# Altium schematic symbol library altera.SCHLIB: 68 symbols (part 5 of 6)
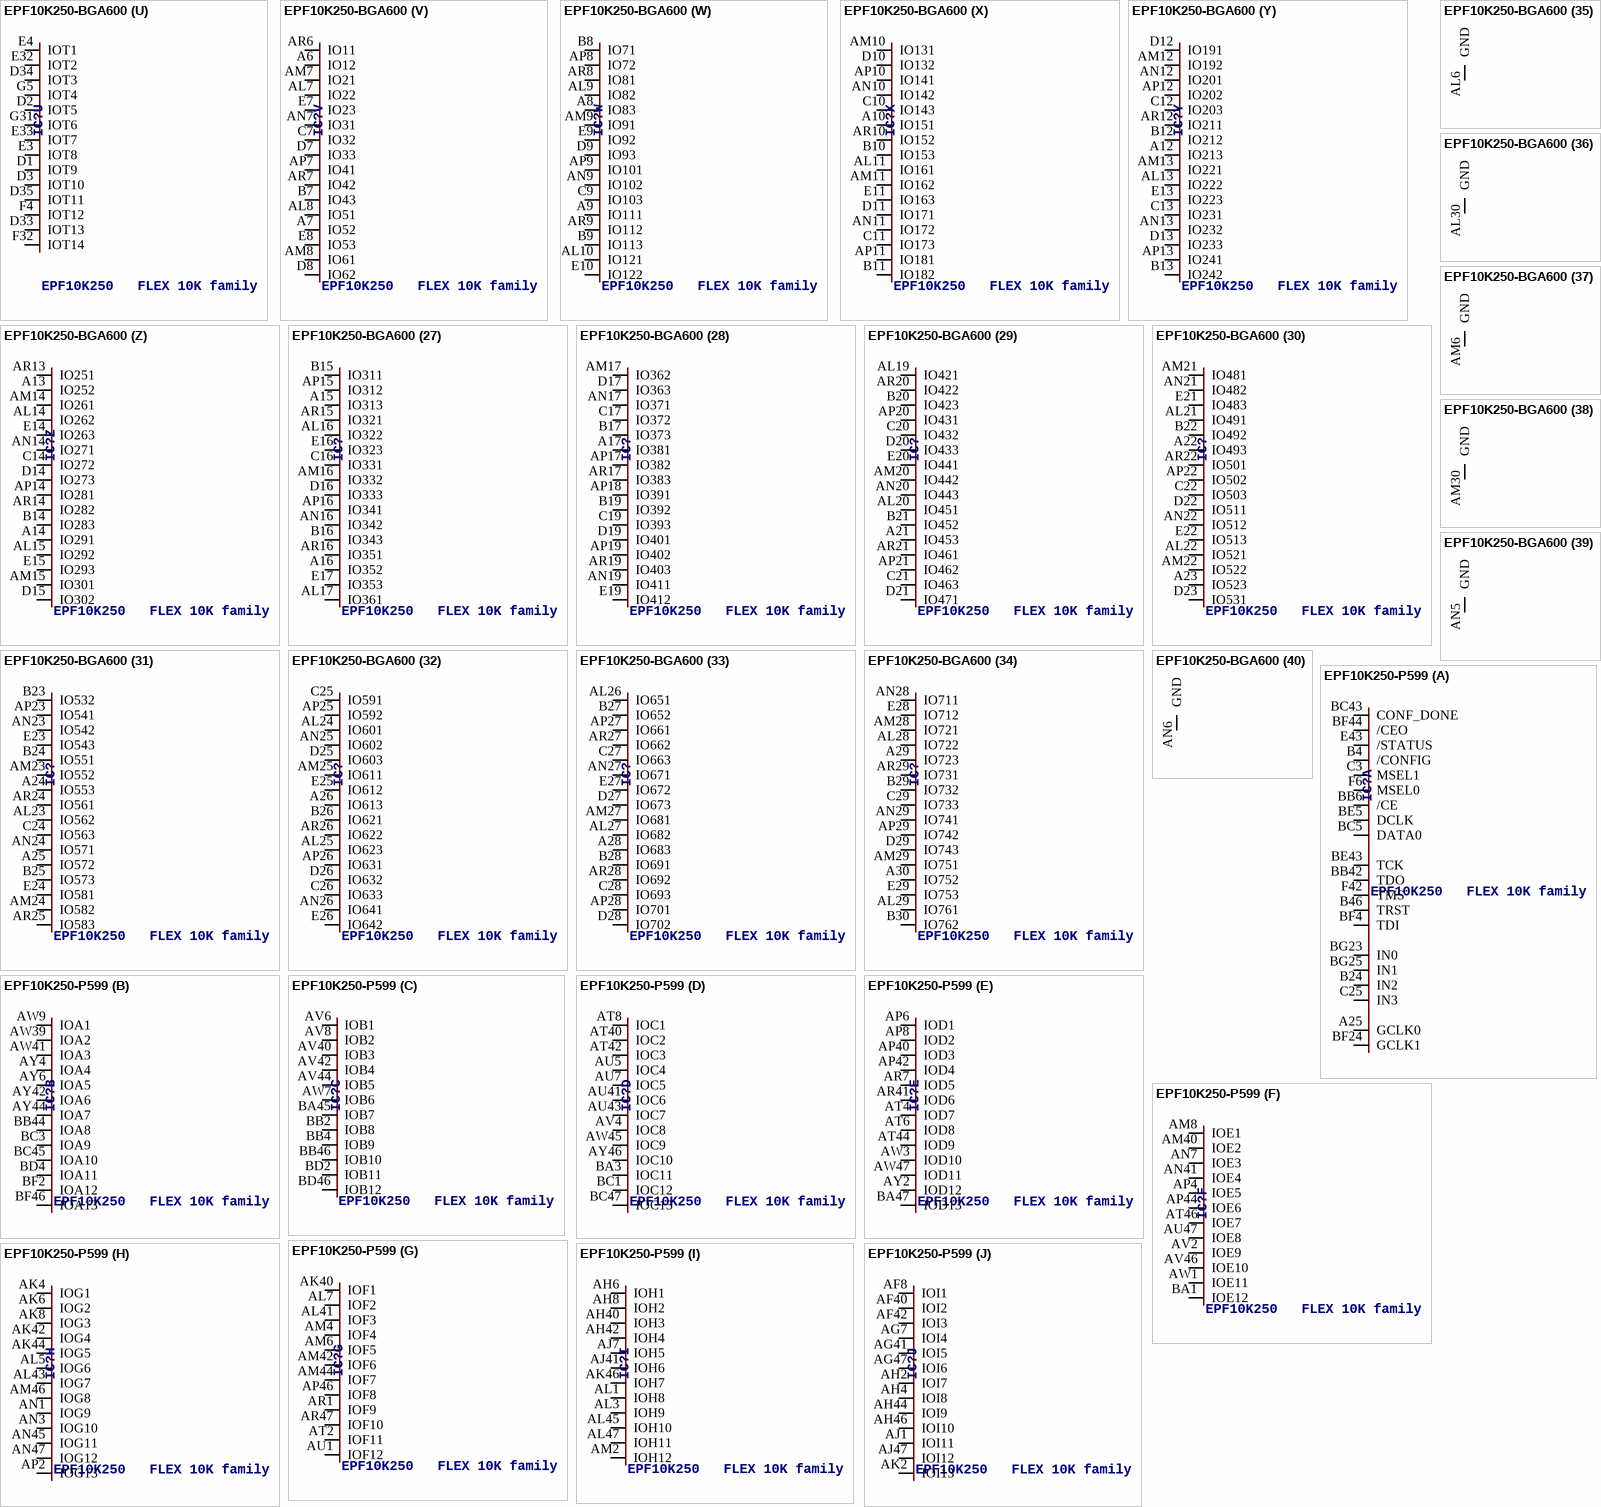
[diagram p61: symbols EPF10K250-BGA600 to EPF10K250-P599]

## EPF10K250-BGA600
designator IC?, comment EPF10K250   FLEX 10K family
OC_FARNELL: unknown; OC_NEWARK: unknown
footprint BGA600
part A pins: AL18 GCLK1, AL31 TCK, AM4 DATA0, AM18 IN1, AM32 CONF_DONE, AN1 TDI, AN2 /CE, AN18 IN0, AN34 TDO, AP1 DCLK, AP35 /CEO, C1 MSEL1, C18 IN2, C34 TRST, C35 TMS, D4 /CONFIG, D18 IN3, D32 /STATUS, E18 GCLK0, F5 MSEL0
part B pins: AJ5 IOA9, AJ31 IOA7, AK5 IOA1, AK32 IOA8, AL4 IOA11, AL32 IOA2, AL33 IOA3, AM1 IOA4, AM2 IOA12, AM3 IOA5, AM33 IOA13, AM34 IOA6, AM35 IOA10
part C pins: AH5 IOB8, AH31 IOB7, AJ4 IOB1, AJ32 IOB4, AK3 IOB11, AK4 IOB9, AK33 IOB10, AK34 IOB5, AL1 IOB2, AL2 IOB6, AL34 IOB12, AL35 IOB3
part D pins: AG31 IOC10, AH4 IOC12, AH32 IOC7, AH33 IOC3, AH34 IOC9, AJ1 IOC4, AJ2 IOC1, AJ3 IOC5, AJ33 IOC2, AJ34 IOC6, AJ35 IOC13, AK1 IOC11, AK2 IOC8
part E pins: AF5 IOD1, AF31 IOD4, AG2 IOD2, AG3 IOD5, AG4 IOD10, AG32 IOD3, AG33 IOD6, AG34 IOD13, AG35 IOD11, AH1 IOD7, AH2 IOD12, AH3 IOD8, AH35 IOD9
part F pins: AE5 IOE1, AE31 IOE8, AE32 IOE2, AE33 IOE7, AF1 IOE9, AF2 IOE3, AF3 IOE11, AF4 IOE5, AF33 IOE6, AF34 IOE10, AF35 IOE4, AG1 IOE12
part G pins: AD3 IOF2, AD4 IOF9, AD5 IOF4, AD31 IOF7, AD32 IOF8, AD33 IOF3, AD34 IOF1, AE1 IOF11, AE2 IOF5, AE3 IOF12, AE34 IOF6, AE35 IOF10
part H pins: AB31 IOG8, AC1 IOG9, AC2 IOG1, AC3 IOG10, AC4 IOG2, AC5 IOG3, AC31 IOG7, AC32 IOG11, AC33 IOG4, AC34 IOG12, AC35 IOG5, AD1 IOG6, AD2 IOG13
part I pins: AA4 IOH8, AA5 IOH1, AA31 IOH4, AA32 IOH7, AB1 IOH9, AB2 IOH2, AB3 IOH12, AB4 IOH5, AB32 IOH6, AB33 IOH10, AB34 IOH3, AB35 IOH11
part J pins: AA1 IOI8, AA2 IOI13, AA3 IOI4, AA34 IOI5, AA35 IOI12, Y3 IOI7, Y4 IOI1, Y5 IOI11, Y31 IOI9, Y32 IOI10, Y33 IOI2, Y34 IOI6, Y35 IOI3
part K pins: V5 IOJ2, V31 IOJ5, W1 IOJ1, W2 IOJ3, W3 IOJ8, W4 IOJ9, W5 IOJ13, W31 IOJ12, W32 IOJ11, W33 IOJ6, W34 IOJ4, W35 IOJ7, Y1 IOJ10
part L pins: U4 IOK3, U5 IOK1, U31 IOK5, U32 IOK7, U33 IOK4, V1 IOK2, V2 IOK8, V3 IOK9, V4 IOK12, V33 IOK11, V34 IOK10, V35 IOK6
part M pins: T2 IOL5, T3 IOL1, T4 IOL6, T5 IOL3, T31 IOL2, T32 IOL7, T33 IOL12, T34 IOL8, U1 IOL4, U2 IOL11, U34 IOL10, U35 IOL9
part N pins: P31 IOM12, P32 IOM3, R1 IOM11, R2 IOM5, R3 IOM10, R4 IOM7, R5 IOM1, R31 IOM8, R32 IOM2, R33 IOM6, R34 IOM13, R35 IOM4, T1 IOM9
part O pins: N3 ION7, N4 ION6, N5 ION2, N31 ION8, N32 ION9, N33 ION1, P1 ION10, P2 ION5, P3 ION12, P4 ION4, P33 ION13, P34 ION3, P35 ION11
part P pins: L35 IOO7, M1 IOO8, M3 IOO2, M4 IOO9, M5 IOO5, M31 IOO11, M32 IOO3, M33 IOO10, M34 IOO1, M35 IOO6, N1 IOO4, N2 IOO12, N35 IOO13
part Q pins: K1 IOP2, K2 IOP8, K33 IOP7, K34 IOP9, K35 IOP1, L1 IOP10, L2 IOP6, L3 IOP11, L4 IOP12, L5 IOP4, L31 IOP3, L32 IOP13, L33 IOP14, L34 IOP5
part R pins: H34 IOQ7, H35 IOQ1, J1 IOQ12, J2 IOQ2, J3 IOQ8, J4 IOQ3, J32 IOQ9, J33 IOQ4, J34 IOQ13, J35 IOQ14, K3 IOQ6, K4 IOQ10, K5 IOQ11, K31 IOQ5
part S pins: G1 IOR5, G2 IOR10, G33 IOR6, G34 IOR4, G35 IOR7, H2 IOR8, H3 IOR3, H4 IOR1, H32 IOR11, H33 IOR2, J5 IOR9, J31 IOR12
part T pins: E1 IOS9, E34 IOS10, E35 IOS2, F1 IOS6, F2 IOS7, F3 IOS1, F33 IOS11, F34 IOS5, G3 IOS13, G4 IOS8, G32 IOS3, H5 IOS4, H31 IOS12
part U pins: D1 IOT9, D2 IOT5, D3 IOT10, D33 IOT13, D34 IOT3, D35 IOT11, E3 IOT8, E4 IOT1, E32 IOT2, E33 IOT7, F4 IOT12, F32 IOT14, G5 IOT4, G31 IOT6
part V pins: A6 IO12, A7 IO52, AL7 IO22, AL8 IO51, AM7 IO21, AM8 IO61, AN7 IO31, AP7 IO41, AR6 IO11, AR7 IO42, B7 IO43, C7 IO32, D7 IO33, D8 IO62, E7 IO23, E8 IO53
part W pins: A8 IO83, A9 IO111, AL9 IO82, AL10 IO121, AM9 IO91, AN9 IO102, AP8 IO72, AP9 IO101, AR8 IO81, AR9 IO112, B8 IO71, B9 IO113, C9 IO103, D9 IO93, E9 IO92, E10 IO122
part X pins: A10 IO151, AL11 IO161, AM10 IO131, AM11 IO162, AN10 IO142, AN11 IO172, AP10 IO141, AP11 IO181, AR10 IO152, B10 IO153, B11 IO182, C10 IO143, C11 IO173, D10 IO132, D11 IO171, E11 IO163
part Y pins: A12 IO213, AL13 IO222, AM12 IO192, AM13 IO221, AN12 IO201, AN13 IO232, AP12 IO202, AP13 IO241, AR12 IO211, B12 IO212, B13 IO242, C12 IO203, C13 IO231, D12 IO191, D13 IO233, E13 IO223
part Z pins: A13 IO252, A14 IO291, AL14 IO262, AL15 IO292, AM14 IO261, AM15 IO301, AN14 IO271, AP14 IO281, AR13 IO251, AR14 IO282, B14 IO283, C14 IO272, D14 IO273, D15 IO302, E14 IO263, E15 IO293
part 27 pins: A15 IO313, A16 IO352, AL16 IO322, AL17 IO361, AM16 IO332, AN16 IO342, AP15 IO312, AP16 IO341, AR15 IO321, AR16 IO351, B15 IO311, B16 IO343, C16 IO331, D16 IO333, E16 IO323, E17 IO353
part 28 pins: A17 IO381, AM17 IO362, AN17 IO371, AN19 IO411, AP17 IO382, AP18 IO391, AP19 IO402, AR17 IO383, AR19 IO403, B17 IO373, B19 IO392, C17 IO372, C19 IO393, D17 IO363, D19 IO401, E19 IO412
part 29 pins: A21 IO453, AL19 IO421, AL20 IO451, AM20 IO442, AN20 IO443, AP20 IO431, AP21 IO462, AR20 IO422, AR21 IO461, B20 IO423, B21 IO452, C20 IO432, C21 IO463, D20 IO433, D21 IO471, E20 IO441
part 30 pins: A22 IO493, A23 IO523, AL21 IO491, AL22 IO521, AM21 IO481, AM22 IO522, AN21 IO482, AN22 IO512, AP22 IO502, AR22 IO501, B22 IO492, C22 IO503, D22 IO511, D23 IO531, E21 IO483, E22 IO513
part 31 pins: A24 IO553, A25 IO572, AL23 IO562, AM23 IO552, AM24 IO582, AN23 IO542, AN24 IO571, AP23 IO541, AR24 IO561, AR25 IO583, B23 IO532, B24 IO551, B25 IO573, C24 IO563, E23 IO543, E24 IO581
part 32 pins: A26 IO613, AL24 IO601, AL25 IO623, AM25 IO611, AN25 IO602, AN26 IO641, AP25 IO592, AP26 IO631, AR26 IO622, B26 IO621, C25 IO591, C26 IO633, D25 IO603, D26 IO632, E25 IO612, E26 IO642
part 33 pins: A28 IO683, AL26 IO651, AL27 IO682, AM27 IO681, AN27 IO671, AP27 IO661, AP28 IO701, AR27 IO662, AR28 IO692, B27 IO652, B28 IO691, C27 IO663, C28 IO693, D27 IO673, D28 IO702, E27 IO672
part 34 pins: A29 IO723, A30 IO752, AL28 IO722, AL29 IO761, AM28 IO721, AM29 IO751, AN28 IO711, AN29 IO741, AP29 IO742, AR29 IO731, B29 IO732, B30 IO762, C29 IO733, D29 IO743, E28 IO712, E29 IO753
part 35 pins: AL6 GND (power)
part 36 pins: AL30 GND (power)
part 37 pins: AM6 GND (power)
part 38 pins: AM30 GND (power)
part 39 pins: AN5 GND (power)
part 40 pins: AN6 GND (power)
part 41 pins: AN30 GND (power)
part 42 pins: AN31 GND (power)
part 43 pins: AN35 GND (power)
part 44 pins: AP2 GND (power)
part 45 pins: AP3 GND (power)
part 46 pins: AP4 GND (power)
part 47 pins: AP5 GND (power)
part 48 pins: AP6 GND (power)
part 49 pins: AP30 GND (power)
part 50 pins: AP31 GND (power)
part 51 pins: AP32 GND (power)
part 52 pins: AP33 GND (power)
part 53 pins: AR1 GND (power)
part 54 pins: AR2 GND (power)
part 55 pins: AR3 GND (power)
part 56 pins: AR4 GND (power)
part 57 pins: AR5 GND (power)
part 58 pins: AR30 GND (power)
part 59 pins: AR31 GND (power)
part 60 pins: AR32 GND (power)
part 61 pins: AR33 GND (power)
part 62 pins: AR34 GND (power)
part 63 pins: AR35 GND (power)
part 64 pins: A1 GND (power)
part 65 pins: A2 GND (power)
part 66 pins: A3 GND (power)
part 67 pins: A4 GND (power)
part 68 pins: A5 GND (power)
part 69 pins: A18 GND (power)
part 70 pins: A31 GND (power)
part 71 pins: A32 GND (power)
part 72 pins: A33 GND (power)
part 73 pins: A34 GND (power)
part 74 pins: A35 GND (power)
part 75 pins: B2 GND (power)
part 76 pins: B3 GND (power)
part 77 pins: B4 GND (power)
part 78 pins: B5 GND (power)
part 79 pins: B6 GND (power)
part 80 pins: B31 GND (power)
part 81 pins: B32 GND (power)
part 82 pins: B33 GND (power)
part 83 pins: B34 GND (power)
part 84 pins: B35 GND (power)
part 85 pins: C5 GND (power)
part 86 pins: C6 GND (power)
part 87 pins: C30 GND (power)
part 88 pins: C31 GND (power)
part 89 pins: D6 GND (power)
part 90 pins: D30 GND (power)
part 91 pins: E6 GND (power)
part 92 pins: E30 GND (power)
part 93 pins: AA33 VCC (power)
part 94 pins: AB5 VCC (power)
part 95 pins: AD35 VCC (power)
part 96 pins: AE4 VCC (power)
part 97 pins: AF32 VCC (power)
part 98 pins: AG5 VCC (power)
part 99 pins: AK31 VCC (power)
part 100 pins: AK35 VCC (power)
part 101 pins: AL3 VCC (power)
part 102 pins: AP24 VCC (power)
part 103 pins: AR11 VCC (power)
part 104 pins: AR18 VCC (power)
part 105 pins: A11 VCC (power)
part 106 pins: A19 VCC (power)
part 107 pins: B1 VCC (power)
part 108 pins: B18 VCC (power)
part 109 pins: D24 VCC (power)
part 110 pins: E2 VCC (power)
part 111 pins: F31 VCC (power)
part 112 pins: F35 VCC (power)
part 113 pins: H1 VCC (power)
part 114 pins: K32 VCC (power)
part 115 pins: M2 VCC (power)
part 116 pins: N34 VCC (power)
part 117 pins: P5 VCC (power)
part 118 pins: T35 VCC (power)
part 119 pins: U3 VCC (power)
part 120 pins: V32 VCC (power)
part 121 pins: Y2 VCC (power)
part 122 pins: AL5 VCCIO (power)
part 123 pins: AL12 VCCIO (power)
part 124 pins: AM5 VCCIO (power)
part 125 pins: AM19 VCCIO (power)
part 126 pins: AM26 VCCIO (power)
part 127 pins: AM31 VCCIO (power)
part 128 pins: AN3 VCCIO (power)
part 129 pins: AN4 VCCIO (power)
part 130 pins: AN8 VCCIO (power)
part 131 pins: AN15 VCCIO (power)
part 132 pins: AN32 VCCIO (power)
part 133 pins: AN33 VCCIO (power)
part 134 pins: AP34 VCCIO (power)
part 135 pins: AR23 VCCIO (power)
part 136 pins: A20 VCCIO (power)
part 137 pins: A27 VCCIO (power)
part 138 pins: C2 VCCIO (power)
part 139 pins: C3 VCCIO (power)
part 140 pins: C4 VCCIO (power)
part 141 pins: C8 VCCIO (power)
part 142 pins: C15 VCCIO (power)
part 143 pins: C23 VCCIO (power)
part 144 pins: C32 VCCIO (power)
part 145 pins: C33 VCCIO (power)
part 146 pins: D5 VCCIO (power)
part 147 pins: D31 VCCIO (power)
part 148 pins: E5 VCCIO (power)
part 149 pins: E12 VCCIO (power)
part 150 pins: E31 VCCIO (power)

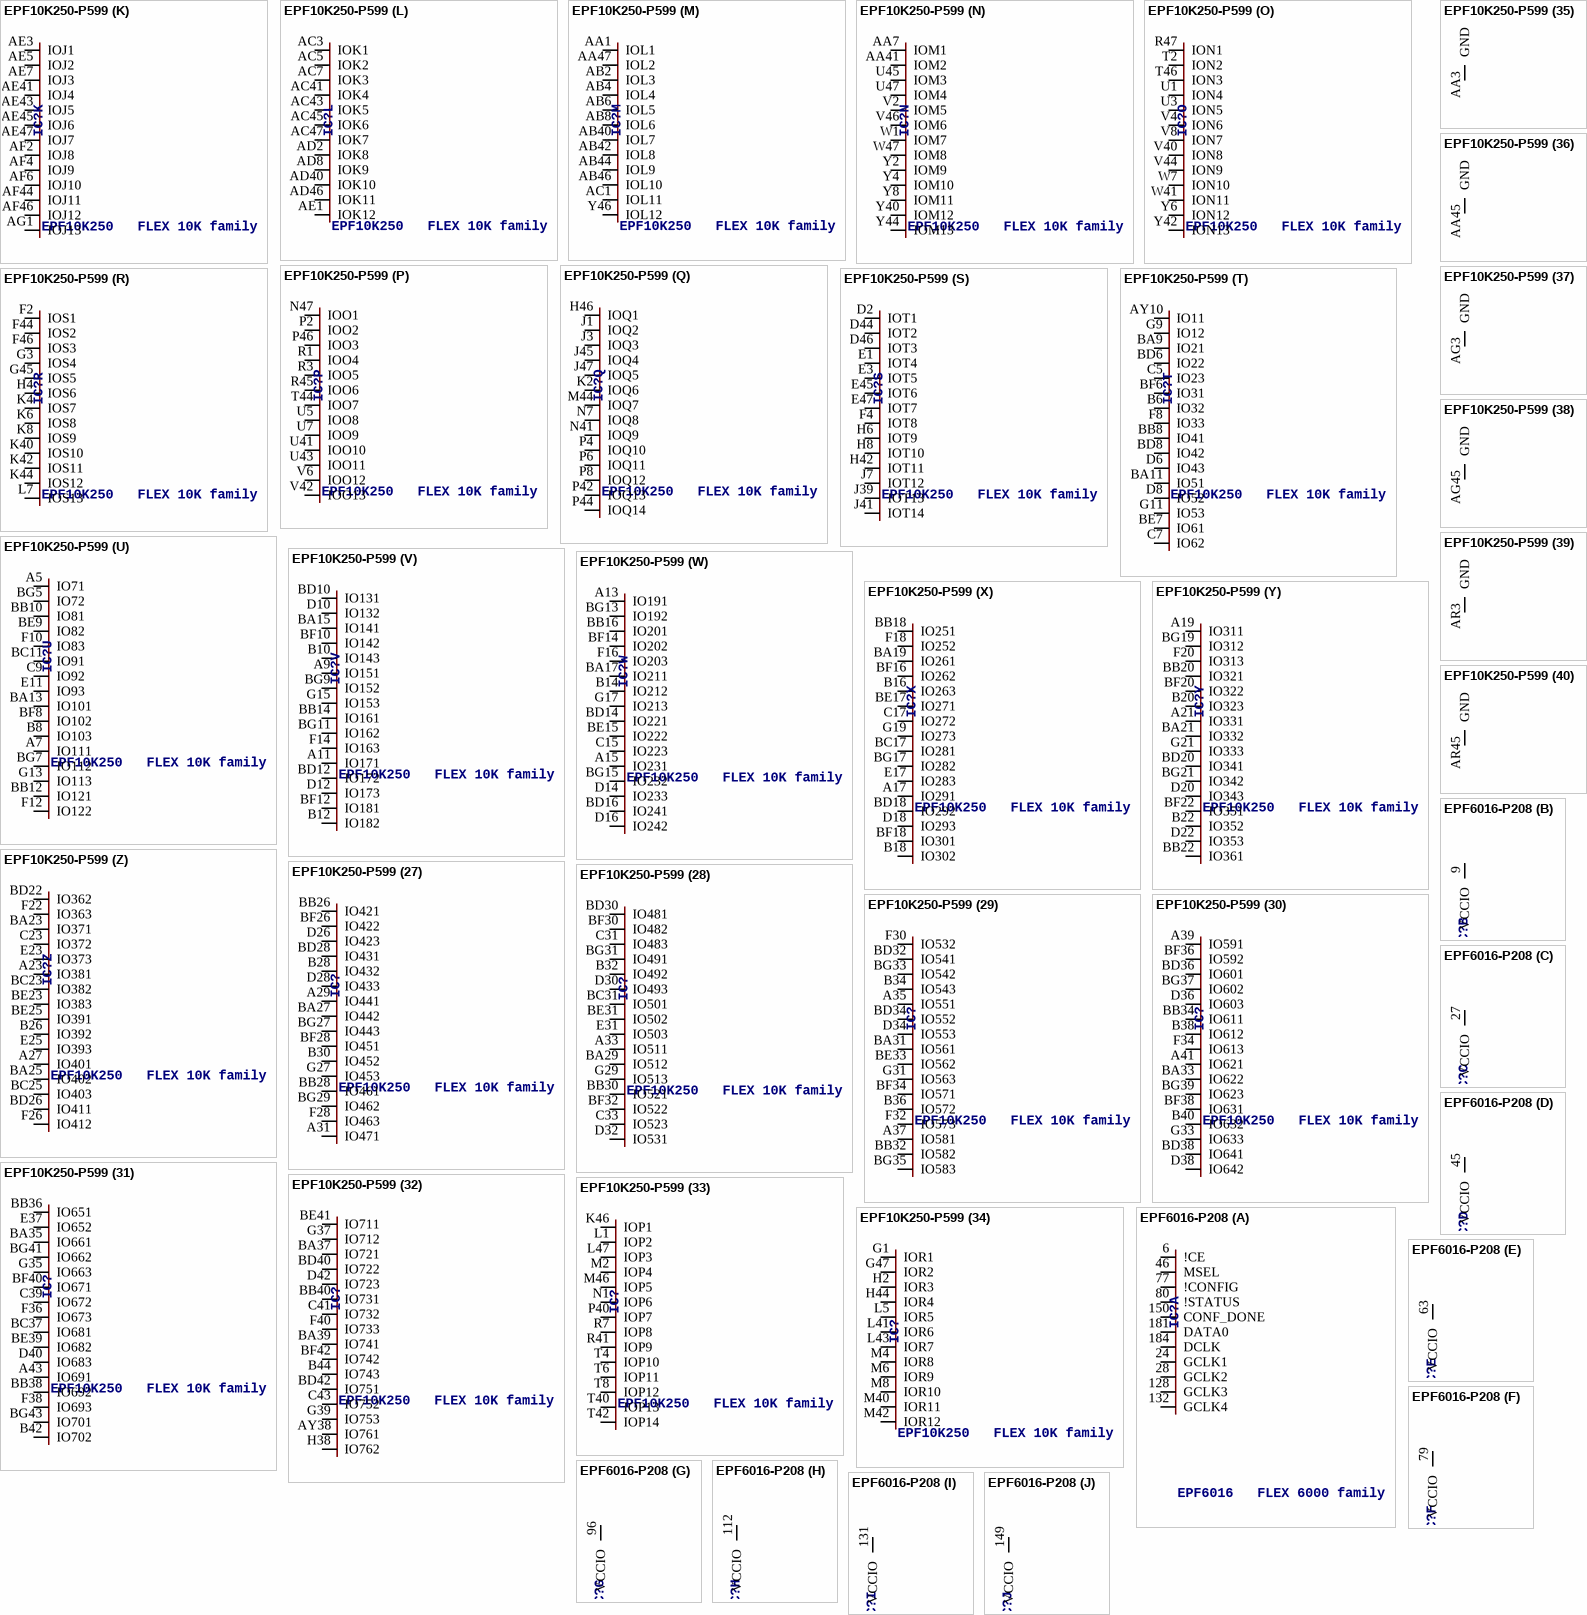
[diagram p37: symbols EPF10K250-P599 to EPF6016-P208]

## EPF10K250-P599
designator IC?, comment EPF10K250   FLEX 10K family
OC_FARNELL: unknown; OC_NEWARK: unknown
footprint PGA599
part A pins: A25 GCLK0, B4 /CONFIG, B24 IN2, B46 TRST, BB6 /CE, BB42 TDO, BC5 DATA0, BC43 CONF_DONE, BE5 DCLK, BE43 TCK, BF4 TDI, BF24 GCLK1, BF44 /CEO, BG23 IN0, BG25 IN1, C3 MSEL1, C25 IN3, E43 /STATUS, F6 MSEL0, F42 TMS
part B pins: AW9 IOA1, AW39 IOA2, AW41 IOA3, AY4 IOA4, AY6 IOA5, AY42 IOA6, AY44 IOA7, BB44 IOA8, BC3 IOA9, BC45 IOA10, BD4 IOA11, BF2 IOA12, BF46 IOA13
part C pins: AV6 IOB1, AV8 IOB2, AV40 IOB3, AV42 IOB4, AV44 IOB5, AW7 IOB6, BA45 IOB7, BB2 IOB8, BB4 IOB9, BB46 IOB10, BD2 IOB11, BD46 IOB12
part D pins: AT8 IOC1, AT40 IOC2, AT42 IOC3, AU5 IOC4, AU7 IOC5, AU41 IOC6, AU43 IOC7, AV4 IOC8, AW45 IOC9, AY46 IOC10, BA3 IOC11, BC1 IOC12, BC47 IOC13
part E pins: AP6 IOD1, AP8 IOD2, AP40 IOD3, AP42 IOD4, AR7 IOD5, AR41 IOD6, AT4 IOD7, AT6 IOD8, AT44 IOD9, AW3 IOD10, AW47 IOD11, AY2 IOD12, BA47 IOD13
part F pins: AM8 IOE1, AM40 IOE2, AN7 IOE3, AN41 IOE4, AP4 IOE5, AP44 IOE6, AT46 IOE7, AU47 IOE8, AV2 IOE9, AV46 IOE10, AW1 IOE11, BA1 IOE12
part G pins: AK40 IOF1, AL7 IOF2, AL41 IOF3, AM4 IOF4, AM6 IOF5, AM42 IOF6, AM44 IOF7, AP46 IOF8, AR1 IOF9, AR47 IOF10, AT2 IOF11, AU1 IOF12
part H pins: AK4 IOG1, AK6 IOG2, AK8 IOG3, AK42 IOG4, AK44 IOG5, AL5 IOG6, AL43 IOG7, AM46 IOG8, AN1 IOG9, AN3 IOG10, AN45 IOG11, AN47 IOG12, AP2 IOG13
part I pins: AH6 IOH1, AH8 IOH2, AH40 IOH3, AH42 IOH4, AJ7 IOH5, AJ41 IOH6, AK46 IOH7, AL1 IOH8, AL3 IOH9, AL45 IOH10, AL47 IOH11, AM2 IOH12
part J pins: AF8 IOI1, AF40 IOI2, AF42 IOI3, AG7 IOI4, AG41 IOI5, AG47 IOI6, AH2 IOI7, AH4 IOI8, AH44 IOI9, AH46 IOI10, AJ1 IOI11, AJ47 IOI12, AK2 IOI13
part K pins: AE3 IOJ1, AE5 IOJ2, AE7 IOJ3, AE41 IOJ4, AE43 IOJ5, AE45 IOJ6, AE47 IOJ7, AF2 IOJ8, AF4 IOJ9, AF6 IOJ10, AF44 IOJ11, AF46 IOJ12, AG1 IOJ13
part L pins: AC3 IOK1, AC5 IOK2, AC7 IOK3, AC41 IOK4, AC43 IOK5, AC45 IOK6, AC47 IOK7, AD2 IOK8, AD8 IOK9, AD40 IOK10, AD46 IOK11, AE1 IOK12
part M pins: AA1 IOL1, AA47 IOL2, AB2 IOL3, AB4 IOL4, AB6 IOL5, AB8 IOL6, AB40 IOL7, AB42 IOL8, AB44 IOL9, AB46 IOL10, AC1 IOL11, Y46 IOL12
part N pins: AA7 IOM1, AA41 IOM2, U45 IOM3, U47 IOM4, V2 IOM5, V46 IOM6, W1 IOM7, W47 IOM8, Y2 IOM9, Y4 IOM10, Y8 IOM11, Y40 IOM12, Y44 IOM13
part O pins: R47 ION1, T2 ION2, T46 ION3, U1 ION4, U3 ION5, V4 ION6, V8 ION7, V40 ION8, V44 ION9, W7 ION10, W41 ION11, Y6 ION12, Y42 ION13
part P pins: N47 IOO1, P2 IOO2, P46 IOO3, R1 IOO4, R3 IOO5, R45 IOO6, T44 IOO7, U5 IOO8, U7 IOO9, U41 IOO10, U43 IOO11, V6 IOO12, V42 IOO13
part Q pins: H46 IOQ1, J1 IOQ2, J3 IOQ3, J45 IOQ4, J47 IOQ5, K2 IOQ6, M44 IOQ7, N7 IOQ8, N41 IOQ9, P4 IOQ10, P6 IOQ11, P8 IOQ12, P42 IOQ13, P44 IOQ14
part R pins: F2 IOS1, F44 IOS2, F46 IOS3, G3 IOS4, G45 IOS5, H4 IOS6, K4 IOS7, K6 IOS8, K8 IOS9, K40 IOS10, K42 IOS11, K44 IOS12, L7 IOS13
part S pins: D2 IOT1, D44 IOT2, D46 IOT3, E1 IOT4, E3 IOT5, E45 IOT6, E47 IOT7, F4 IOT8, H6 IOT9, H8 IOT10, H42 IOT11, J7 IOT12, J39 IOT13, J41 IOT14
part T pins: AY10 IO11, B6 IO32, BA9 IO21, BA11 IO51, BB8 IO41, BD6 IO22, BD8 IO42, BE7 IO61, BF6 IO31, C5 IO23, C7 IO62, D6 IO43, D8 IO52, F8 IO33, G9 IO12, G11 IO53
part U pins: A5 IO71, A7 IO111, B8 IO103, BA13 IO101, BB10 IO81, BB12 IO121, BC11 IO91, BE9 IO82, BF8 IO102, BG5 IO72, BG7 IO112, C9 IO92, E11 IO93, F10 IO83, F12 IO122, G13 IO113
part V pins: A9 IO151, A11 IO171, B10 IO143, B12 IO182, BA15 IO141, BB14 IO161, BD10 IO131, BD12 IO172, BF10 IO142, BF12 IO181, BG9 IO152, BG11 IO162, D10 IO132, D12 IO173, F14 IO163, G15 IO153
part W pins: A13 IO191, A15 IO231, B14 IO212, BA17 IO211, BB16 IO201, BD14 IO221, BD16 IO241, BE15 IO222, BF14 IO202, BG13 IO192, BG15 IO232, C15 IO223, D14 IO233, D16 IO242, F16 IO203, G17 IO213
part X pins: A17 IO291, B16 IO263, B18 IO302, BA19 IO261, BB18 IO251, BC17 IO281, BD18 IO292, BE17 IO271, BF16 IO262, BF18 IO301, BG17 IO282, C17 IO272, D18 IO293, E17 IO283, F18 IO252, G19 IO273
part Y pins: A19 IO311, A21 IO331, B20 IO323, B22 IO352, BA21 IO332, BB20 IO321, BB22 IO361, BD20 IO341, BF20 IO322, BF22 IO351, BG19 IO312, BG21 IO342, D20 IO343, D22 IO353, F20 IO313, G21 IO333
part Z pins: A23 IO381, A27 IO401, B26 IO392, BA23 IO371, BA25 IO402, BC23 IO382, BC25 IO403, BD22 IO362, BD26 IO411, BE23 IO383, BE25 IO391, C23 IO372, E23 IO373, E25 IO393, F22 IO363, F26 IO412
part 27 pins: A29 IO441, A31 IO471, B28 IO432, B30 IO452, BA27 IO442, BB26 IO421, BB28 IO461, BD28 IO431, BF26 IO422, BF28 IO451, BG27 IO443, BG29 IO462, D26 IO423, D28 IO433, F28 IO463, G27 IO453
part 28 pins: A33 IO511, B32 IO492, BA29 IO512, BB30 IO521, BC31 IO501, BD30 IO481, BE31 IO502, BF30 IO482, BF32 IO522, BG31 IO491, C31 IO483, C33 IO523, D30 IO493, D32 IO531, E31 IO503, G29 IO513
part 29 pins: A35 IO551, A37 IO581, B34 IO543, B36 IO572, BA31 IO561, BB32 IO582, BD32 IO541, BD34 IO552, BE33 IO562, BF34 IO571, BG33 IO542, BG35 IO583, D34 IO553, F30 IO532, F32 IO573, G31 IO563
part 30 pins: A39 IO591, A41 IO621, B38 IO612, B40 IO632, BA33 IO622, BB34 IO611, BD36 IO601, BD38 IO641, BF36 IO592, BF38 IO631, BG37 IO602, BG39 IO623, D36 IO603, D38 IO642, F34 IO613, G33 IO633
part 31 pins: A43 IO691, B42 IO702, BA35 IO661, BB36 IO651, BB38 IO692, BC37 IO681, BE39 IO682, BF40 IO671, BG41 IO662, BG43 IO701, C39 IO672, D40 IO683, E37 IO652, F36 IO673, F38 IO693, G35 IO663
part 32 pins: AY38 IO761, B44 IO743, BA37 IO721, BA39 IO741, BB40 IO731, BD40 IO722, BD42 IO751, BE41 IO711, BF42 IO742, C41 IO732, C43 IO752, D42 IO723, F40 IO733, G37 IO712, G39 IO753, H38 IO762
part 33 pins: K46 IOP1, L1 IOP2, L47 IOP3, M2 IOP4, M46 IOP5, N1 IOP6, P40 IOP7, R7 IOP8, R41 IOP9, T4 IOP10, T6 IOP11, T8 IOP12, T40 IOP13, T42 IOP14
part 34 pins: G1 IOR1, G47 IOR2, H2 IOR3, H44 IOR4, L5 IOR5, L41 IOR6, L43 IOR7, M4 IOR8, M6 IOR9, M8 IOR10, M40 IOR11, M42 IOR12
part 35 pins: AA3 GND (power)
part 36 pins: AA45 GND (power)
part 37 pins: AG3 GND (power)
part 38 pins: AG45 GND (power)
part 39 pins: AR3 GND (power)
part 40 pins: AR45 GND (power)
part 41 pins: A47 GND (power)
part 42 pins: BD44 GND (power)
part 43 pins: BE3 GND (power)
part 44 pins: BE13 GND (power)
part 45 pins: BE21 GND (power)
part 46 pins: BE27 GND (power)
part 47 pins: BE35 GND (power)
part 48 pins: BE45 GND (power)
part 49 pins: BG1 GND (power)
part 50 pins: BG47 GND (power)
part 51 pins: B2 GND (power)
part 52 pins: C13 GND (power)
part 53 pins: C21 GND (power)
part 54 pins: C27 GND (power)
part 55 pins: C35 GND (power)
part 56 pins: C45 GND (power)
part 57 pins: D4 GND (power)
part 58 pins: G23 GND (power)
part 59 pins: N3 GND (power)
part 60 pins: N45 GND (power)
part 61 pins: AD6 GNDIO (power)
part 62 pins: AD42 GNDIO (power)
part 63 pins: AJ5 GNDIO (power)
part 64 pins: AJ43 GNDIO (power)
part 65 pins: AR5 GNDIO (power)
part 66 pins: AR43 GNDIO (power)
part 67 pins: AY8 GNDIO (power)
part 68 pins: AY40 GNDIO (power)
part 69 pins: BA5 GNDIO (power)
part 70 pins: BA43 GNDIO (power)
part 71 pins: BB24 GNDIO (power)
part 72 pins: BC7 GNDIO (power)
part 73 pins: BC13 GNDIO (power)
part 74 pins: BC19 GNDIO (power)
part 75 pins: BC29 GNDIO (power)
part 76 pins: BC35 GNDIO (power)
part 77 pins: BC41 GNDIO (power)
part 78 pins: E7 GNDIO (power)
part 79 pins: E13 GNDIO (power)
part 80 pins: E19 GNDIO (power)
part 81 pins: E29 GNDIO (power)
part 82 pins: E35 GNDIO (power)
part 83 pins: E41 GNDIO (power)
part 84 pins: F24 GNDIO (power)
part 85 pins: G5 GNDIO (power)
part 86 pins: G43 GNDIO (power)
part 87 pins: H40 GNDIO (power)
part 88 pins: N5 GNDIO (power)
part 89 pins: N43 GNDIO (power)
part 90 pins: W5 GNDIO (power)
part 91 pins: W43 GNDIO (power)
part 92 pins: AJ3 VCC (power)
part 93 pins: AJ45 VCC (power)
part 94 pins: AU3 VCC (power)
part 95 pins: AU45 VCC (power)
part 96 pins: A3 VCC (power)
part 97 pins: A45 VCC (power)
part 98 pins: BE1 VCC (power)
part 99 pins: BE11 VCC (power)
part 100 pins: BE19 VCC (power)
part 101 pins: BE29 VCC (power)
part 102 pins: BE37 VCC (power)
part 103 pins: BE47 VCC (power)
part 104 pins: BG3 VCC (power)
part 105 pins: BG45 VCC (power)
part 106 pins: C1 VCC (power)
part 107 pins: C11 VCC (power)
part 108 pins: C19 VCC (power)
part 109 pins: C29 VCC (power)
part 110 pins: C37 VCC (power)
part 111 pins: C47 VCC (power)
part 112 pins: E5 VCC (power)
part 113 pins: G25 VCC (power)
part 114 pins: L3 VCC (power)
part 115 pins: L45 VCC (power)
part 116 pins: W3 VCC (power)
part 117 pins: W45 VCC (power)
part 118 pins: AA5 VCCIO (power)
part 119 pins: AA43 VCCIO (power)
part 120 pins: AD4 VCCIO (power)
part 121 pins: AD44 VCCIO (power)
part 122 pins: AG5 VCCIO (power)
part 123 pins: AG43 VCCIO (power)
part 124 pins: AN5 VCCIO (power)
part 125 pins: AN43 VCCIO (power)
part 126 pins: AW5 VCCIO (power)
part 127 pins: AW43 VCCIO (power)
part 128 pins: BA7 VCCIO (power)
part 129 pins: BA41 VCCIO (power)
part 130 pins: BC9 VCCIO (power)
part 131 pins: BC15 VCCIO (power)
part 132 pins: BC21 VCCIO (power)
part 133 pins: BC27 VCCIO (power)
part 134 pins: BC33 VCCIO (power)
part 135 pins: BC39 VCCIO (power)
part 136 pins: BD24 VCCIO (power)
part 137 pins: D24 VCCIO (power)
part 138 pins: E9 VCCIO (power)
part 139 pins: E15 VCCIO (power)
part 140 pins: E21 VCCIO (power)
part 141 pins: E27 VCCIO (power)
part 142 pins: E33 VCCIO (power)
part 143 pins: E39 VCCIO (power)
part 144 pins: G7 VCCIO (power)
part 145 pins: G41 VCCIO (power)
part 146 pins: J5 VCCIO (power)
part 147 pins: J43 VCCIO (power)
part 148 pins: R5 VCCIO (power)
part 149 pins: R43 VCCIO (power)

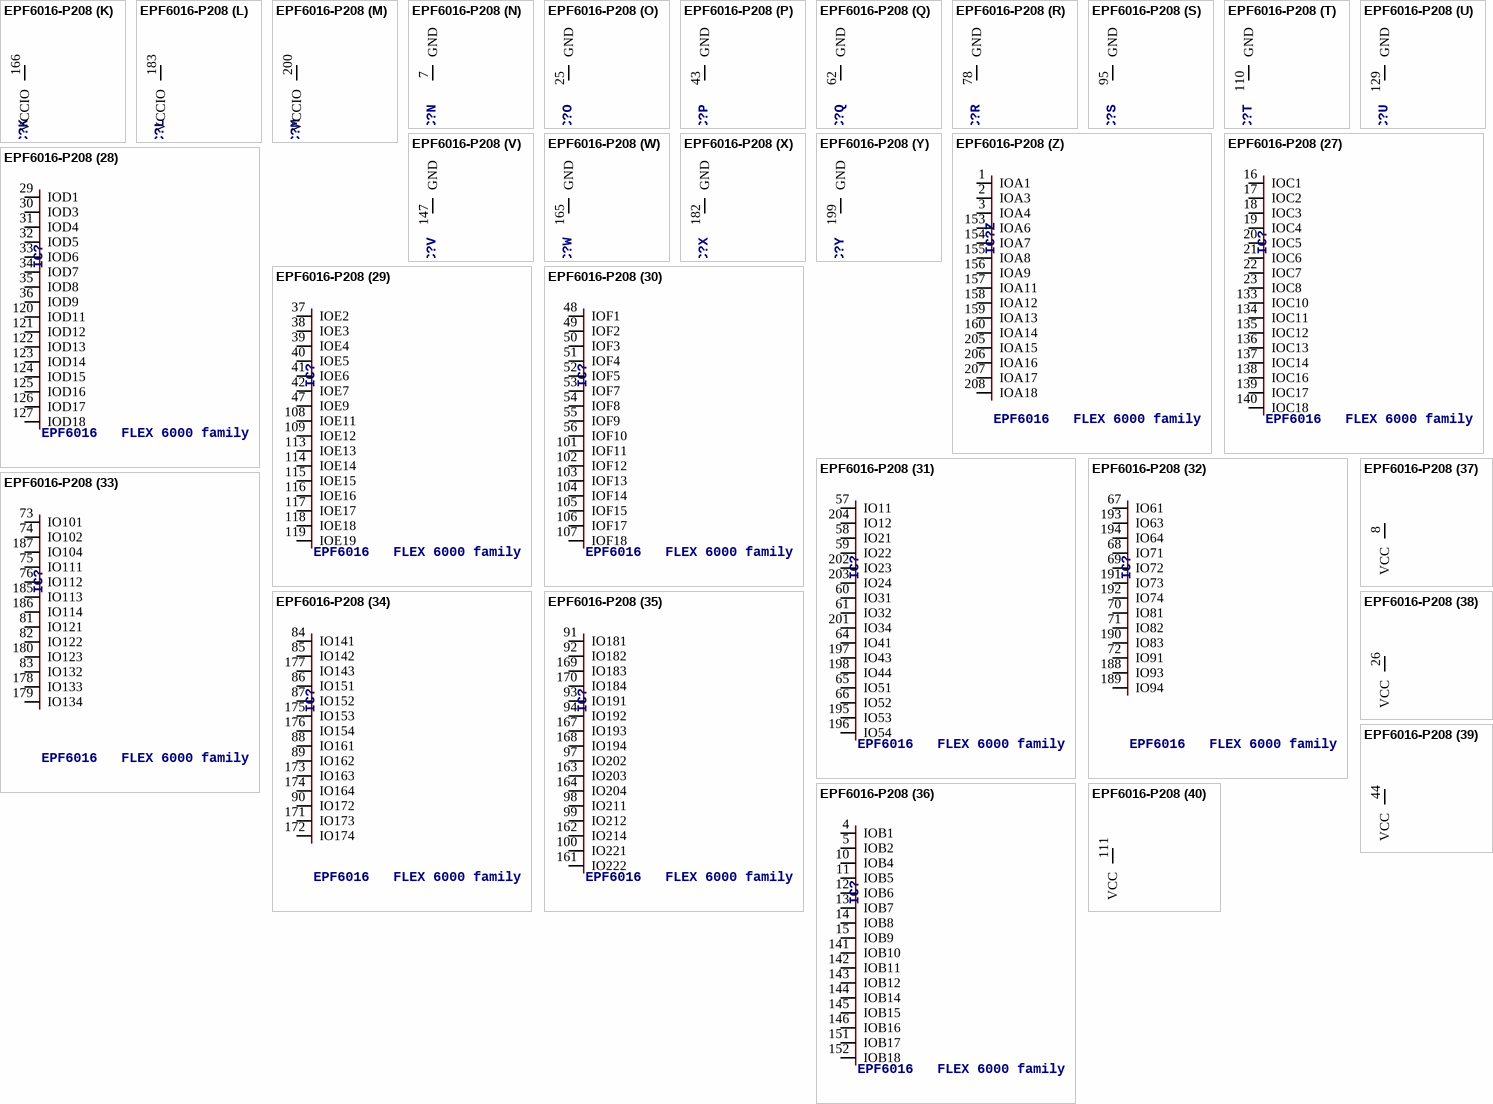
[diagram p38: symbol EPF6016-P208]
